# Altium footprint library ICL_modules_v1.PcbLib: 24 footprints (part 1 of 2)
Each footprint in its own frame and in the unit in brackets; x right, y up, seen from the top. Pads: shape width x height; smd on the part's side, far side on the other; paste and mask are expansions set on the pad; w line width, h text height; cw(c..) or ccw(c..) is an arc to the next point about the centre after c.
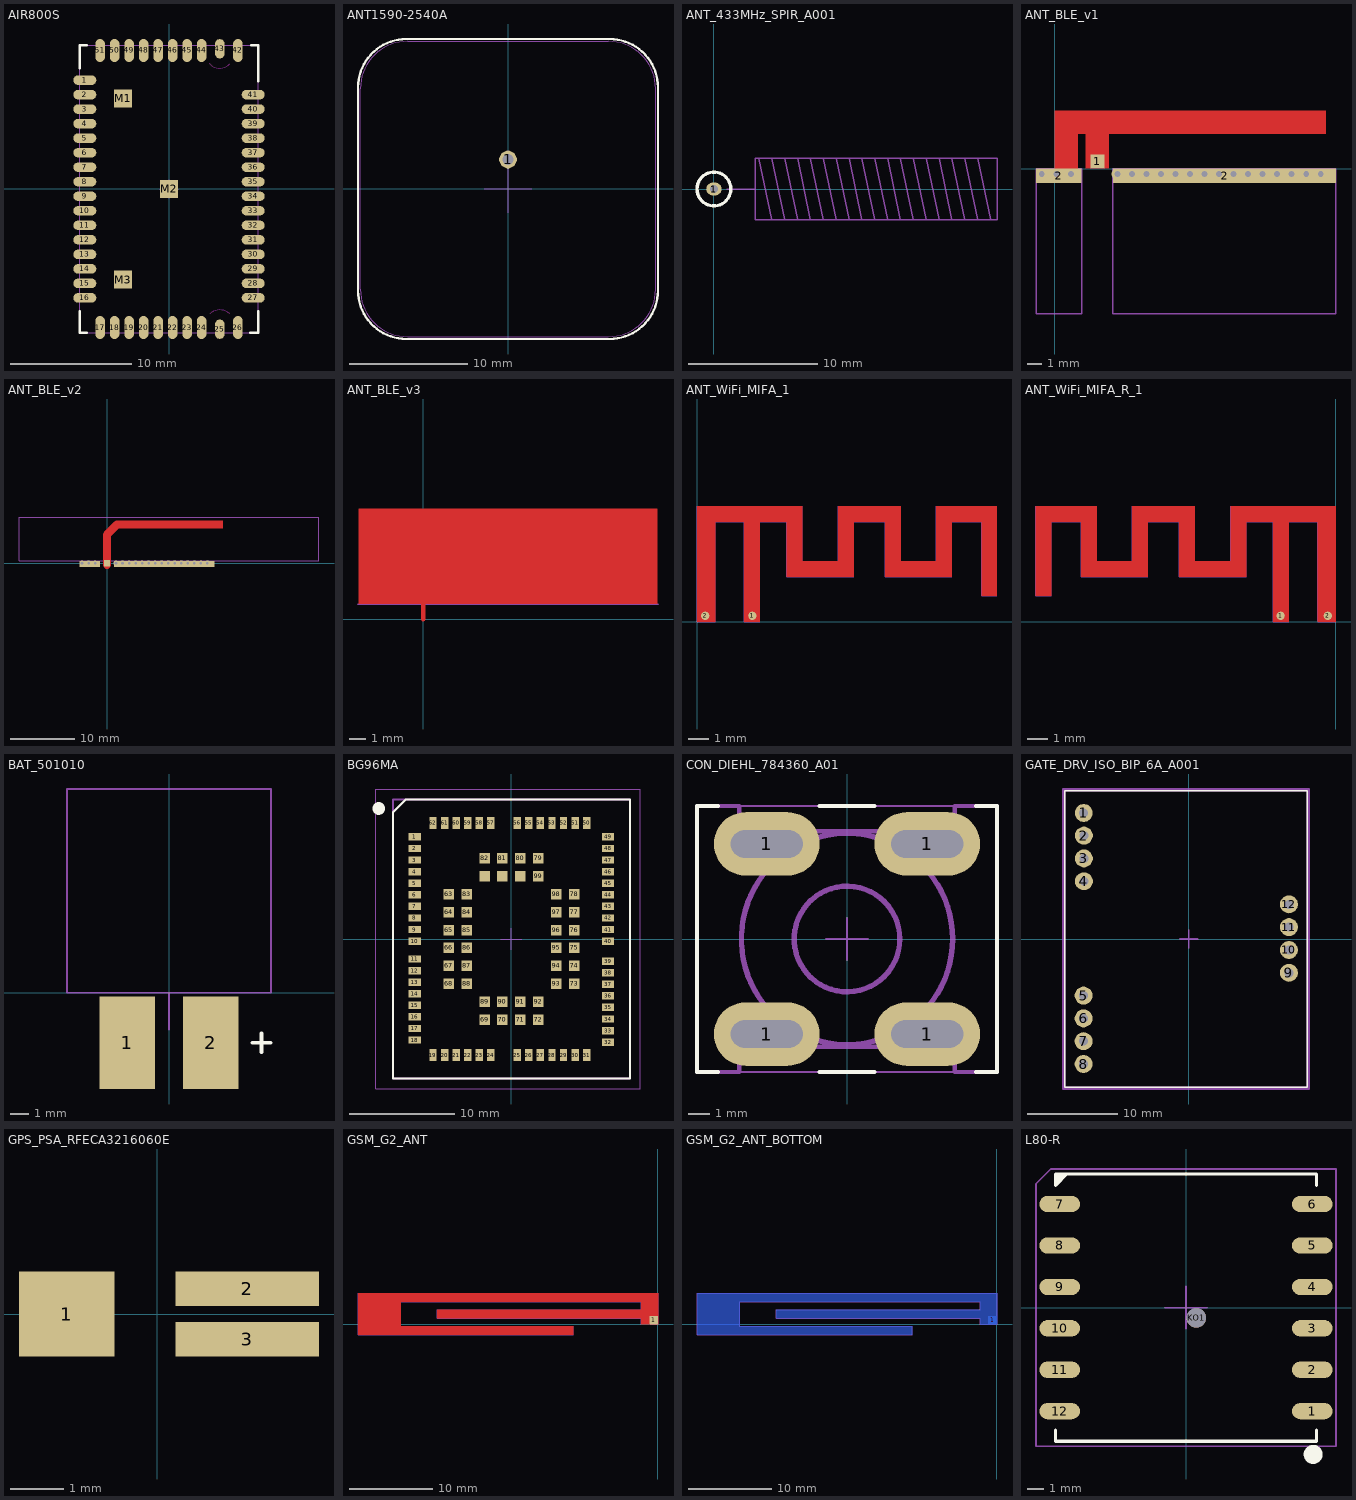
[diagram p0: the footprints below, top view; thin cyan lines are the x and y axes]

## AIR800S [mm]
pads (54):
  oval 1.9x0.8 smd paste+0 mask+0.102: 1(-6.96,9) 2(-6.96,7.8) 3(-6.96,6.6) 4(-6.96,5.4) 5(-6.96,4.2) 6(-6.96,3) 7(-6.96,1.8) 8(-6.96,0.6) 9(-6.96,-0.6) 10(-6.96,-1.8) 11(-6.96,-3) 12(-6.96,-4.2) 13(-6.96,-5.4) 14(-6.96,-6.6) 15(-6.96,-7.8) 16(-6.96,-9) 27(6.96,-9) 28(6.96,-7.8) 29(6.96,-6.6) 30(6.96,-5.4) 31(6.96,-4.2) 32(6.96,-3) 33(6.96,-1.8) 34(6.96,-0.6) 35(6.96,0.6) 36(6.96,1.8) 37(6.96,3) 38(6.96,4.2) 39(6.96,5.4) 40(6.96,6.6) 41(6.96,7.8)
  oval 0.8x1.9 smd paste+0 mask+0.102: 17(-5.7,-11.46) 18(-4.5,-11.46) 19(-3.3,-11.46) 20(-2.1,-11.46) 21(-0.9,-11.46) 22(0.3,-11.46) 23(1.5,-11.46) 24(2.7,-11.46) 26(5.7,-11.46) 42(5.7,11.46) 44(2.7,11.46) 45(1.5,11.46) 46(0.3,11.46) 47(-0.9,11.46) 48(-2.1,11.46) 49(-3.3,11.46) 50(-4.5,11.46) 51(-5.7,11.46)
  oval 0.8x1.6 smd paste+0 mask+0.102: 25(4.2,-11.6) 43(4.2,11.6)
  rect 1.5x1.5 smd paste+0 mask+0.102: M1(-3.8,7.5) M2(0,0) M3(-3.8,-7.5)
Top Overlay:
  lines w0.2: -7.4,-10.1 -7.4,-11.9 -6.8,-11.9 ; -7.4,10 -7.4,11.9 -6.8,11.9 ; 6.7,-11.9 7.4,-11.9 7.4,-10.1 ; 6.8,11.9 7.4,11.9 7.4,8.9
Keep-Out Layer:
  lines w0.1: 3.32,10.384 ccw(c4.2,11.2) 5.044,10.347 ; 3.367,-10.336 cw(c4.2,-11.2) 5.013,-10.318
Top M15-16_SORG:
  lines w0.1: -0.75,0 0.75,0 ; 0,-0.75 0,0.75 ; -7.4,-11.9 -7.4,11.9 7.4,11.9 7.4,-11.9 -7.4,-11.9
3D body "AIR_800S.STEP": height 3, standoff 0, extent -7.435,-11.935 7.435,11.935

## ANT1590-2540A [mm] "GPS_ANT"
pads (1):
  round 1.5 hole 0.9 mask+0.1: 1(0,2.5)
Top Overlay:
  lines w0.2: -12.7,-8.6 ccw(c-8.6,-8.6) -8.6,-12.7 8.6,-12.7 ccw(c8.6,-8.6) 12.7,-8.6 12.7,8.6 ccw(c8.6,8.6) 8.6,12.7 -8.6,12.7 ccw(c-8.6,8.6) -12.7,8.6 -12.7,-8.6
Top M15-16_SORG:
  lines w0.1: -2,0 0,0 ; 0,-2 0,0 ; 0,2 0,0 ; 2,0 0,0 ; -12.5,-8.5 ccw(c-8.5,-8.5) -8.5,-12.5 8.5,-12.5 ccw(c8.5,-8.5) 12.5,-8.5 12.5,8.5 ccw(c8.5,8.5) 8.5,12.5 -8.5,12.5 ccw(c-8.5,8.5) -12.5,8.5 -12.5,-8.5
3D body "GPS_ANT_v1.STEP": height 4.73, standoff -3.17, extent -12.65,-12.65 12.65,12.65

## ANT_433MHz_SPIR_A001 [mm]
pads (1):
  oval 1.2x1 hole 0.6 mask+0.102: 1(0,0)
Top Overlay:
  circle w0.254: c0,0 r1.315
Top M15-16_SORG:
  lines w0.1: 1,0 3.2,0 ; 3.5,2.4 4.5,-2.4 ; 4.5,2.4 5.5,-2.4 ; 5.5,2.4 6.5,-2.4 ; 6.5,2.4 7.5,-2.4 ; 7.5,2.4 8.5,-2.4 ; 8.5,2.4 9.5,-2.4 ; 9.5,2.4 10.5,-2.4 ; 10.5,2.4 11.5,-2.4 ; 11.5,2.4 12.5,-2.4 ; 12.5,2.4 13.5,-2.4 ; 13.5,2.4 14.5,-2.4 ; 14.5,2.4 15.5,-2.4 ; 15.5,2.4 16.5,-2.4 ; 16.5,2.4 17.5,-2.4 ; 17.5,2.4 18.5,-2.4 ; 18.5,2.4 19.5,-2.4 ; 19.5,2.4 20.5,-2.4 ; 20.5,2.4 21.5,-2.4 ; 3.2,-2.4 22,-2.4 22,2.4 3.2,2.4 3.2,-2.4
3D body "anten 433MHz.STEP": height 4.8, standoff -3.83, extent -0.293,-2.289 19.207,2.311

## ANT_BLE_v1 [mm] "2,4GHz"
pads (3):
  rect 1x1 smd mask+0.1: 1(3,0.5)
  rect 3.2x1 smd mask+0.1: 2(0.3,-0.5)
  rect 15.6x1 smd mask+0.1: 2(11.9,-0.5)
via 0.127,-0.381 diameter 0.8 hole 0.4
via 1.143,-0.381 diameter 0.8 hole 0.4
via -0.889,-0.381 diameter 0.8 hole 0.4
via 4.4,-0.381 diameter 0.8 hole 0.4
via 5.416,-0.381 diameter 0.8 hole 0.4
via 6.432,-0.381 diameter 0.8 hole 0.4
via 8.464,-0.381 diameter 0.8 hole 0.4
via 7.448,-0.381 diameter 0.8 hole 0.4
via 10.496,-0.381 diameter 0.8 hole 0.4
via 9.48,-0.381 diameter 0.8 hole 0.4
via 12.528,-0.381 diameter 0.8 hole 0.4
via 11.512,-0.381 diameter 0.8 hole 0.4
via 14.56,-0.381 diameter 0.8 hole 0.4
via 13.544,-0.381 diameter 0.8 hole 0.4
via 16.592,-0.381 diameter 0.8 hole 0.4
via 15.576,-0.381 diameter 0.8 hole 0.4
via 18.624,-0.381 diameter 0.8 hole 0.4
via 17.608,-0.381 diameter 0.8 hole 0.4
Top Layer:
  rectangle: 0,2.413 18.999,4.064
  rectangle: 0,-0.1 1.651,4.064
  rectangle: 2.159,0 3.81,4.064
Top M15-16_SORG:
  lines w0.1: -1.27,-10.16 -1.27,0 1.905,0 1.905,-10.16 -1.27,-10.16 ; 4.064,-10.16 4.064,0 19.685,0 19.685,-10.16 4.064,-10.16

## ANT_BLE_v2 [mm] "2,4GHz from NORDIC"
pads (3):
  rect 1x1 smd mask+0.1: 1(0,0)
  rect 3.2x1 smd mask+0.1: 2(-2.7,-0.1)
  rect 15.6x1 smd mask+0.1: 2(8.9,-0.1)
via -2.873,0.019 diameter 0.8 hole 0.4
via -1.857,0.019 diameter 0.8 hole 0.4
via -3.889,0.019 diameter 0.8 hole 0.4
via 1.4,0.019 diameter 0.8 hole 0.4
via 2.416,0.019 diameter 0.8 hole 0.4
via 3.432,0.019 diameter 0.8 hole 0.4
via 5.464,0.019 diameter 0.8 hole 0.4
via 4.448,0.019 diameter 0.8 hole 0.4
via 7.496,0.019 diameter 0.8 hole 0.4
via 6.48,0.019 diameter 0.8 hole 0.4
via 9.528,0.019 diameter 0.8 hole 0.4
via 8.512,0.019 diameter 0.8 hole 0.4
via 11.56,0.019 diameter 0.8 hole 0.4
via 10.544,0.019 diameter 0.8 hole 0.4
via 13.592,0.019 diameter 0.8 hole 0.4
via 12.576,0.019 diameter 0.8 hole 0.4
via 15.624,0.019 diameter 0.8 hole 0.4
via 14.608,0.019 diameter 0.8 hole 0.4
Top Layer:
  region: 18.048,5.391 18.048,6.661 17.286,6.661 17.286,5.391
  lines w1.27: 0,-0.225 0,4.464 1.559,6.023 17.401,6.023
Top M15-16_SORG:
  lines w0.1: -13.7,0.4 -13.7,7.2 33,7.2 33,0.4 -13.7,0.4
3D body: height 0.04, standoff 0, extent -0.7,-0.2 18,6.7

## ANT_BLE_v3 [mm]
Top Layer:
  pour cut-out: 13.97,6.598 13.97,0.934 -3.861,0.934 -3.861,6.598
  lines w0.254: 0,0 0,5.727 2.218,5.727 2.218,2.784 4.275,2.784 4.275,5.727 6.256,5.727 6.256,2.758 8.212,2.758 8.212,5.727 10.092,5.727 10.092,2.763
Top M15-16_SORG:
  lines w0.1: -3.9,0.9 14,0.9

## ANT_WiFi_MIFA_1 [mm]
pads (2):
  round 0.4 smd mask+0.102: 1(2.7,0.3) 2(0.4,0.3)
Top Layer:
  region: 0,0 0.881,0 0.881,4.9 2.3,4.9 2.3,0 3.054,0 3.054,4.9 4.373,4.9 4.373,2.2 7.638,2.2 7.638,4.9 9.184,4.9 9.184,2.2 12.438,2.2 12.438,4.9 13.884,4.9 13.884,1.275 14.638,1.275 14.638,5.654 11.684,5.654 11.684,2.954 9.938,2.954 9.938,5.654 6.884,5.654 6.884,2.954 5.127,2.954 5.127,5.654 0,5.654
Mechanical 2:
  lines w0.013: 0,0 0,5.654 5.127,5.654 5.127,2.954 6.884,2.954 6.884,5.654 9.938,5.654 9.938,2.954 11.684,2.954 11.684,5.654 14.638,5.654 14.638,1.275 13.884,1.275 13.884,4.9 12.438,4.9 12.438,2.2 9.184,2.2 9.184,4.9 7.638,4.9 7.638,2.2 4.373,2.2 4.373,4.9 3.054,4.9 3.054,0 2.3,0 2.3,4.9 0.881,4.9 0.881,0 0,0
3D body: height 0.01, standoff 0, extent 0,0 14.638,5.654

## ANT_WiFi_MIFA_R_1 [mm]
pads (2):
  round 0.4 smd mask+0.102: 1(-2.7,0.3) 2(-0.4,0.3)
Top Layer:
  region: 0,0 -0.881,0 -0.881,4.9 -2.3,4.9 -2.3,0 -3.054,0 -3.054,4.9 -4.373,4.9 -4.373,2.2 -7.638,2.2 -7.638,4.9 -9.184,4.9 -9.184,2.2 -12.438,2.2 -12.438,4.9 -13.884,4.9 -13.884,1.275 -14.638,1.275 -14.638,5.654 -11.684,5.654 -11.684,2.954 -9.938,2.954 -9.938,5.654 -6.884,5.654 -6.884,2.954 -5.127,2.954 -5.127,5.654 0,5.654
Mechanical 2:
  lines w0.013: -14.638,1.275 -13.884,1.275 -13.884,4.9 -12.438,4.9 -12.438,2.2 -9.184,2.2 -9.184,4.9 -7.638,4.9 -7.638,2.2 -4.373,2.2 -4.373,4.9 -3.054,4.9 -3.054,0 -2.3,0 -2.3,4.9 -0.881,4.9 -0.881,0 0,0 0,5.654 -5.127,5.654 -5.127,2.954 -6.884,2.954 -6.884,5.654 -9.938,5.654 -9.938,2.954 -11.684,2.954 -11.684,5.654 -14.638,5.654 -14.638,1.275
3D body: height 0.01, standoff 0, extent -14.638,0 0,5.654

## BAT_501010 [mm] "battery 10x10x5"
pads (2):
  rect 3x5 smd: 1(-2.25,-2.7) 2(2.25,-2.7)
Top Overlay:
  lines w0.2: 4.5,-2.7 5.5,-2.7 ; 5,-3.2 5,-2.2
Top M11-12_SMOT:
  lines w0.1: -5.5,0 -5.5,11 5.5,11 5.5,0 0,0 -5.5,0
Top M13-14_SDES:
  text "'.Designator'" at -6.798,-6.8 h1.2
Top M15-16_SORG:
  lines w0.1: -2.5,0 0,0 ; 0,-2 0,0 ; 2.5,0 0,0
3D body "501010_v1.stp": height 1.21, standoff -4.79, extent -5.5,-5 5.5,11

## BG96MA [mm]
pads (102):
  rect 1.15x0.7 smd: 1(-9.18,9.7) 2(-9.18,8.6) 3(-9.18,7.5) 4(-9.18,6.4) 5(-9.18,5.3) 6(-9.18,4.2) 7(-9.18,3.1) 8(-9.18,2) 9(-9.18,0.9) 10(-9.18,-0.2) 11(-9.18,-1.9) 12(-9.18,-3) 13(-9.18,-4.1) 14(-9.18,-5.2) 15(-9.18,-6.3) 16(-9.18,-7.4) 17(-9.18,-8.5) 18(-9.18,-9.6) 32(9.18,-9.8) 33(9.18,-8.7) 34(9.18,-7.6) 35(9.18,-6.5) 36(9.18,-5.4) 37(9.18,-4.3) 38(9.18,-3.2) 39(9.18,-2.1) 40(9.18,-0.2) 41(9.18,0.9) 42(9.18,2) 43(9.18,3.1) 44(9.18,4.2) 45(9.18,5.3) 46(9.18,6.4) 47(9.18,7.5) 48(9.18,8.6) 49(9.18,9.7)
  rect 0.7x1.15 smd: 19(-7.45,-11.025) 20(-6.35,-11.025) 21(-5.25,-11.025) 22(-4.15,-11.025) 23(-3.05,-11.025) 24(-1.95,-11.025) 25(0.55,-11.025) 26(1.65,-11.025) 27(2.75,-11.025) 28(3.85,-11.025) 29(4.95,-11.025) 30(6.05,-11.025) 31(7.15,-11.025) 50(7.15,11.025) 51(6.05,11.025) 52(4.95,11.025) 53(3.85,11.025) 54(2.75,11.025) 55(1.65,11.025) 56(0.55,11.025) 57(-1.95,11.025) 58(-3.05,11.025) 59(-4.15,11.025) 60(-5.25,11.025) 61(-6.35,11.025) 62(-7.45,11.025)
  rrect0% 1x1 smd: 63(-5.95,4.25) 64(-5.95,2.55) 65(-5.95,0.85) 66(-5.95,-0.85) 67(-5.95,-2.55) 68(-5.95,-4.25) 69(-2.55,-7.65) 70(-0.85,-7.65) 71(0.85,-7.65) 72(2.55,-7.65) 73(5.95,-4.25) 74(5.95,-2.55) 75(5.95,-0.85) 76(5.95,0.85) 77(5.95,2.55) 78(5.95,4.25) 79(2.55,7.65) 80(0.85,7.65) 81(-0.85,7.65) 82(-2.55,7.65) 83(-4.25,4.25) 84(-4.25,2.55) 85(-4.25,0.85) 86(-4.25,-0.85) 87(-4.25,-2.55) 88(-4.25,-4.25) 89(-2.55,-5.95) 90(-0.85,-5.95) 91(0.85,-5.95) 92(2.55,-5.95) 93(4.25,-4.25) 94(4.25,-2.55) 95(4.25,-0.85) 96(4.25,0.85) 97(4.25,2.55) 98(4.25,4.25) 99(2.55,5.95) 100(0.85,5.95) 101(-0.85,5.95) 102(-2.55,5.95)
Top Overlay:
  circle w0.6: c-12.6,12.4 r0.3
  lines w0.2: -11.25,-13.25 11.25,-13.25 11.25,13.25 -10.05,13.25 -11.25,12.05 -11.25,-13.25
Top M15-16_SORG:
  lines w0.1: -1,0 0,0 ; 0,-1 0,0 ; 0,1 0,0 ; 1,0 0,0
  lines w0.2: -11.25,-13.25 11.25,-13.25 11.25,13.25 -11.25,13.25 -11.25,-13.25
Bottom M19-20_TMOT:
  lines w0.1: -12.9,-14.25 12.25,-14.25 ; -12.9,-14.25 -12.9,14.25 ; -12.9,-14.25 12.25,-14.25 ; -12.9,-14.25 -12.9,14.25 ; -12.9,14.25 12.25,14.25 ; -12.9,14.25 12.25,14.25 ; 12.25,-14.25 12.25,14.25 ; 12.25,-14.25 12.25,14.25
3D body "BG96.STEP": height 2.5, standoff 0, extent -11.325,-13.325 11.325,13.325

## CON_DIEHL_784360_A01 [mm] "Screw Mounting Bracket"
pads (4):
  oval 5x3 hole 1.3 slot 3.4 at 0 deg paste-1: 1(-3.8,-4.5) 1(-3.8,4.5) 1(3.8,-4.5) 1(3.8,4.5)
Top Overlay:
  lines w0.2: -6.1,-6.3 -7.1,-6.3 -7.1,6.3 -6.1,6.3 ; -1.3,-6.3 1.3,-6.3 ; -1.3,6.3 1.3,6.3 ; 6.1,-6.3 7.1,-6.3 7.1,6.3 6.1,6.3
Top M15-16_SORG:
  lines w0.1: -1,0 0,0 ; 0,-1 0,0 ; 0,1 0,0 ; 1,0 0,0 ; -7.1,-6.3 -7.1,6.3 7.1,6.3 7.1,-6.3 -7.1,-6.3
Top M17-18_TDES:
  text "'.Designator'" at -6.798,0.5 h1.2
Top M19-20_TMOT:
  circle w0.254: c0,0 r5
  circle w0.254: c0,0 r2.5
  lines w0.2: -7.1,-6.3 -5.1,-6.3 -5.1,-5.1 cw(c-4.05,-5.1) -3,-5.1 3,-5.1 cw(c4.05,-5.1) 5.1,-5.1 5.1,-6.3 7.1,-6.3 7.1,6.3 5.1,6.3 5.1,5.1 cw(c4.05,5.1) 3,5.1 -3,5.1 cw(c-4.05,5.1) -5.1,5.1 -5.1,6.3 -7.1,6.3 -7.1,-6.3
3D body "784360swp001.stp": height 16.9, standoff -3.7, extent -7.1,-6.3 7.1,6.3

## GATE_DRV_ISO_BIP_6A_A001 [mm] "Gate driver module isolated 6A"
pads (12):
  round 2 hole 1: 1(-11.685,14.035) 2(-11.67,11.51) 3(-11.67,8.97) 4(-11.67,6.43) 5(-11.7,-6.3) 6(-11.7,-8.84) 7(-11.7,-11.38) 8(-11.7,-13.92) 9(11.16,-3.76) 10(11.16,-1.22) 11(11.16,1.32) 12(11.16,3.86)
Top Overlay:
  lines w0.2: -13.8,-16.5 13.2,-16.5 13.2,16.5 -13.8,16.5 -13.8,-16.5
Top M15-16_SORG:
  lines w0.2: -1,0 1,0 ; 0,-1 0,1 ; -14,-16.7 13.4,-16.7 13.4,16.7 -14,16.7 -14,-16.7
Top M17-18_TDES:
  text "'.Designator'" at -5.665,-0.417 h1
Top M19-20_TMOT:
  lines w0.2: -13.8,-16.5 -13.8,16.5 13.2,16.5 13.2,-16.5 -13.8,-16.5
3D body "gate_drv_v1.step": height 10.92, standoff -5.83, extent -13.8,-16.5 13.2,16.5

## GPS_PSA_RFECA3216060E [mm] "PSA GPS SMD"
pads (3):
  rect 1.8x1.6 smd: 1(-1.7,0)
  rect 2.7x0.65 smd: 2(1.7,0.475) 3(1.7,-0.475)

## GSM_G2_ANT [mm] "50 Ohm"
pads (1):
  rect 1x1 smd paste-1 mask+0.102: 1(-0.5,0.5)
Top Layer:
  region: -36.252,-1.25 -36.252,3.75 0,3.75 0,0 -2,0 -2,0.75 -26.68,0.75 -26.68,1.75 -2,1.75 -2,2.75 -31.084,2.75 -31.084,-0.25 -10.252,-0.25 -10.252,-1.25
Top M15-16_SORG:
  lines w0.1: -36.252,-1.25 -10.252,-1.25 -10.252,-0.25 -31.084,-0.25 -31.084,2.75 -2,2.75 -2,1.75 -26.68,1.75 -26.68,0.75 -2,0.75 -2,0 0,0 0,3.75 -36.252,3.75 -36.252,-1.25
3D body "ANT_G2_GSM.STEP": height 0.04, standoff 0, extent -36.252,-1.25 0,3.75

## GSM_G2_ANT_BOTTOM [mm] "50 Ohm"
pads (1):
  rect 1x1 smd far side paste-1 mask+0.102: 1(-0.5,0.5)
Bottom Layer:
  region: -36.252,-1.25 -36.252,3.75 0,3.75 0,0 -2,0 -2,0.75 -26.68,0.75 -26.68,1.75 -2,1.75 -2,2.75 -31.084,2.75 -31.084,-0.25 -10.252,-0.25 -10.252,-1.25
Top M15-16_SORG:
  lines w0.1: -36.252,-1.25 -36.252,3.75 0,3.75 0,0 -2,0 -2,0.75 -26.68,0.75 -26.68,1.75 -2,1.75 -2,2.75 -31.084,2.75 -31.084,-0.25 -10.252,-0.25 -10.252,-1.25 -36.252,-1.25

## L80-R [mm]
pads (13):
  oval 2.5x1 smd mask+0.1: 1(7.75,-6.35) 2(7.75,-3.81) 3(7.75,-1.27) 4(7.75,1.27) 5(7.75,3.81) 6(7.75,6.35) 7(-7.75,6.35) 8(-7.75,3.81) 9(-7.75,1.27) 10(-7.75,-1.27) 11(-7.75,-3.81) 12(-7.75,-6.35)
  round 1.2 hole 1.2 unplated mask+0.1: KO1(0.63,-0.63)
Top Overlay:
  circle w0.6: c7.8,-9 r0.283
  region: -8,8.2 -7.3,8.2 -8,7.5
  lines w0.1: -7.3,8.2 -6.8,8.2
  lines w0.2: -8,-7.5 -8,-8.2 8,-8.2 8,-7.5 ; -7.3,8.2 -8,7.5 -8,8.2 8,8.2 8,7.5
Top M15-16_SORG:
  lines w0.1: -1.3,0 0,0 ; 0,-1.3 0,0 ; 0,1.3 0,0 ; 1.3,0 0,0 ; -9.2,-8.5 -9.2,7.6 -8.3,8.5 9.2,8.5 9.2,-8.5 -9.2,-8.5
3D body "quectel-l80.step": height 6.96, standoff 0.01, extent -8,-8 8,8